# Altium footprint library PCB_Kursus_Library.PcbLib: 27 footprints (part 1 of 2)
Each footprint in its own frame and in the unit in brackets; x right, y up, seen from the top. Pads: shape width x height; smd on the part's side, far side on the other; paste and mask are expansions set on the pad; w line width, h text height; cw(c..) or ccw(c..) is an arc to the next point about the centre after c.
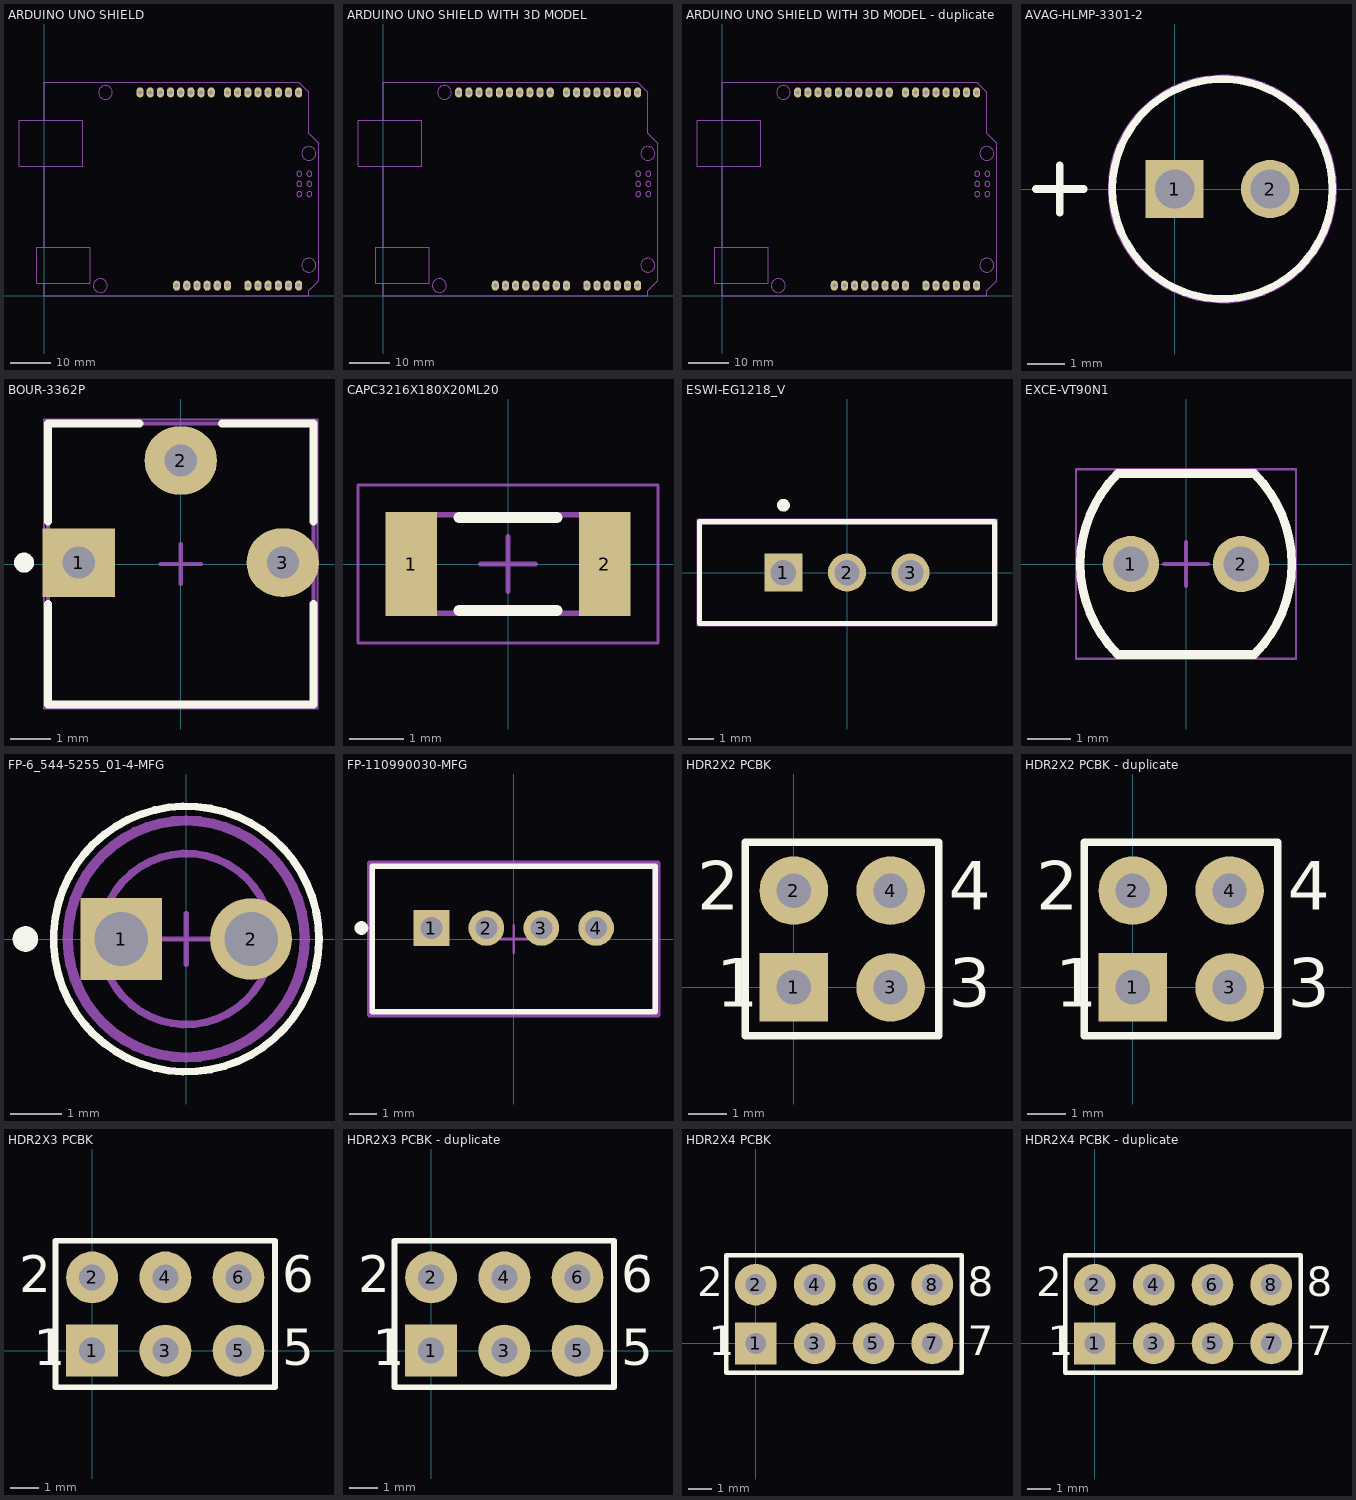
[diagram p0: the footprints below, top view; thin cyan lines are the x and y axes]

## ARDUINO UNO SHIELD [mil]
pads (28):
  oval 70x100 hole 39.37: 1(1300,100) 2(1400,100) 3(1500,100) 4(1600,100) 5(1700,100) 6(1800,100) 7(2000,100) 8(2100,100) 9(2200,100) 10(2300,100) 11(2400,100) 12(2500,100) 13(2500,2000) 14(2400,2000) 15(2300,2000) 16(2200,2000) 17(2100,2000) 18(2000,2000) 19(1900,2000) 20(1800,2000) 21(1640,2000) 22(1540,2000) 23(1440,2000) 24(1340,2000) 25(1240,2000) 26(1140,2000) 27(1040,2000) 28(940,2000)
Mechanical 1:
  circle w10: c550,100 r68
  circle w10: c600,2000 r68
  circle w10: c2600,1400 r68
  circle w10: c2600,300 r68
  circle w10: c2505,1200 r25
  circle w10: c2605,1200 r25
  circle w10: c2505,1100 r25
  circle w10: c2605,1100 r25
  circle w10: c2505,1000 r25
  circle w10: c2605,1000 r25
  lines w10: 0,125 0,0 2600,0 2600,50 2700,150 2700,1500 2600,1600 2600,2000 2500,2100 0,2100 0,1725 ; 0,125 -75,125 -75,475 0,475 ; 0,125 375,125 450,125 450,475 375,475 0,475 ; 0,475 0,1275 ; 0,1275 -250,1275 -250,1725 0,1725 ; 0,1275 375,1275 375,1725 275,1725 0,1725

## ARDUINO UNO SHIELD WITH 3D MODEL [mil]
pads (32):
  oval 70x100 hole 39.37: 1(1300,100) 2(1400,100) 3(1500,100) 4(1600,100) 5(1700,100) 6(1800,100) 7(2000,100) 8(2100,100) 9(2200,100) 10(2300,100) 11(2400,100) 12(2500,100) 13(2500,2000) 14(2400,2000) 15(2300,2000) 16(2200,2000) 17(2100,2000) 18(2000,2000) 19(1900,2000) 20(1800,2000) 21(1640,2000) 22(1540,2000) 23(1440,2000) 24(1340,2000) 25(1240,2000) 26(1140,2000) 27(1040,2000) 28(940,2000) 29(840,2000) 30(740,2000) 31(1200,100) 32(1100,100)
Mechanical 2:
  circle w10: c550,100 r68
  circle w10: c2600,300 r68
  circle w10: c2605,1000 r25
  circle w10: c2505,1000 r25
  circle w10: c2605,1100 r25
  circle w10: c2505,1100 r25
  circle w10: c2605,1200 r25
  circle w10: c2505,1200 r25
  circle w10: c2600,1400 r68
  circle w10: c600,2000 r68
  lines w10: 0,125 -75,125 -75,475 0,475 ; 0,125 0,0 2600,0 2600,50 2700,150 2700,1500 2600,1600 2600,2000 2500,2100 0,2100 0,1725 ; 0,125 375,125 450,125 450,475 375,475 0,475 ; 0,475 0,1275 ; 0,1275 -250,1275 -250,1725 0,1725 ; 0,1275 375,1275 375,1725 275,1725 0,1725
3D body "arduino uno rev3 pinheader v4.step": height 57.01, standoff -663.04, extent -250,0 2700,2100

## ARDUINO UNO SHIELD WITH 3D MODEL - duplicate [mil]
pads (32):
  oval 70x100 hole 39.37: 1(1300,100) 2(1400,100) 3(1500,100) 4(1600,100) 5(1700,100) 6(1800,100) 7(2000,100) 8(2100,100) 9(2200,100) 10(2300,100) 11(2400,100) 12(2500,100) 13(2500,2000) 14(2400,2000) 15(2300,2000) 16(2200,2000) 17(2100,2000) 18(2000,2000) 19(1900,2000) 20(1800,2000) 21(1640,2000) 22(1540,2000) 23(1440,2000) 24(1340,2000) 25(1240,2000) 26(1140,2000) 27(1040,2000) 28(940,2000) 29(840,2000) 30(740,2000) 31(1200,100) 32(1100,100)
Mechanical 2:
  circle w10: c600,2000 r68
  circle w10: c2600,1400 r68
  circle w10: c2505,1200 r25
  circle w10: c2605,1200 r25
  circle w10: c2505,1100 r25
  circle w10: c2605,1100 r25
  circle w10: c2505,1000 r25
  circle w10: c2605,1000 r25
  circle w10: c2600,300 r68
  circle w10: c550,100 r68
  lines w10: 0,125 375,125 450,125 450,475 375,475 0,475 ; 0,125 0,0 2600,0 2600,50 2700,150 2700,1500 2600,1600 2600,2000 2500,2100 0,2100 0,1725 ; 0,125 -75,125 -75,475 0,475 ; 0,475 0,1275 ; 0,1275 375,1275 375,1725 275,1725 0,1725 ; 0,1275 -250,1275 -250,1725 0,1725
3D body "arduino uno rev3 pinheader v4.step": height 57.01, standoff -663.04, extent -250,0 2700,2100

## AVAG-HLMP-3301-2 [mm] "THD, 2-Leads, Body Dia 5.85mm"
pads (2):
  rect 1.55x1.55 hole 1.05: 1(0,0)
  round 1.55 hole 1.05: 2(2.54,0)
Top Overlay:
  circle w0.2: c1.27,0 r2.923
  lines w0.2: -3.683,0 -2.413,0 ; -3.048,-0.635 -3.048,0.635
Mechanical 13:
  circle w0.1: c1.27,0 r2.923
Mechanical 15:
  circle w0.05: c1.27,0 r3.023

## BOUR-3362P [mm]
pads (3):
  rect 1.8x1.7 hole 0.8: 1(-2.54,0.035)
  oval 1.8x1.7 hole 0.8: 2(0,2.575) 3(2.54,0.035)
Top Overlay:
  circle w0.25: c-3.9,0.035 r0.125
  lines w0.2: -3.3,-0.99 -3.3,-3.495 3.3,-3.495 3.3,-0.99 ; -3.3,1.06 -3.3,3.495 -1.025,3.495 ; 1.025,3.495 3.3,3.495 3.3,1.06
Mechanical 13:
  lines w0.1: -3.3,-3.495 3.3,-3.495 3.3,3.495 -3.3,3.495 -3.3,-3.495
Mechanical 15:
  lines w0.05: -3.4,-3.595 -3.4,3.595 3.4,3.595 3.4,-3.595 -3.4,-3.595
  lines w0.1: -0.5,0 0.5,0 ; 0,-0.5 0,0.5
3D body "User Library-R_3362P.STEP": height 4.5, standoff -3, extent -3.3,-3.495 3.3,3.495

## CAPC3216X180X20ML20 [mm]
pads (2):
  rect 0.95x1.9 smd: 1(-1.775,0) 2(1.775,0)
Top Overlay:
  lines w0.2: -0.9,-0.85 0.9,-0.85 ; -0.9,0.85 0.9,0.85
Mechanical 13:
  lines w0.1: -1.7,-0.9 1.7,-0.9 1.7,0.9 -1.7,0.9 -1.7,-0.9
Mechanical 15:
  lines w0.05: -2.75,-1.45 2.75,-1.45 2.75,1.45 -2.75,1.45 -2.75,-1.45
  lines w0.1: -0.5,0 0.5,0 ; 0,-0.5 0,0.5
3D body "CAPC3216X18M.step": height 1.8, standoff 0, extent -1.7,-0.9 1.7,0.9

## ESWI-EG1218_V [mm]
pads (3):
  rect 1.5x1.5 hole 1: 1(-2.5,0)
  round 1.5 hole 1: 2(0,0) 3(2.5,0)
Top Overlay:
  circle w0.25: c-2.5,2.65 r0.125
  lines w0.2: -5.8,-2 -5.8,2 5.8,2 5.8,-2 -5.8,-2
Mechanical 13:
  lines w0.1: -5.8,-2 -5.8,2 5.8,2 5.8,-2 -5.8,-2
Mechanical 15:
  lines w0.05: -5.9,-2.1 -5.9,2.1 5.9,2.1 5.9,-2.1 -5.9,-2.1
  lines w0.1: -0.5,0 0.5,0 ; 0,-0.5 0,0.5
3D body "User Library-EG1218.STEP": height 7.4, standoff -4.7, extent -5.8,-2 5.8,2

## EXCE-VT90N1 [mm]
pads (2):
  round 1.3 hole 0.8: 1(-1.27,0) 2(1.27,0)
Top Overlay:
  lines w0.2: -1.575,-2.085 cw(c0.51,0) -1.575,2.085 1.575,2.085 cw(c-0.51,0) 1.575,-2.085 -1.575,-2.085
Mechanical 13:
  lines w0.1: -1.575,-2.085 cw(c0.51,0) -1.575,2.085 1.575,2.085 cw(c-0.51,0) 1.575,-2.085 -1.575,-2.085
Mechanical 15:
  lines w0.05: -2.54,-2.185 2.54,-2.185 2.54,2.185 -2.54,2.185 -2.54,-2.185
  lines w0.1: -0.5,0 0.5,0 ; 0,-0.5 0,0.5
3D body: height 2.29, standoff 0, extent -2.439,-2.086 2.439,2.086

## FP-6_544-5255_01-4-MFG [mm]
pads (2):
  rect 1.6x1.6 hole 1.05 paste-2539.97 mask+0: 1(-1.27,0)
  round 1.6 hole 1.05 paste-2539.97 mask+0: 2(1.27,0)
Top Overlay:
  circle w0.15: c0,0 r2.6
  circle w0.25: c-3.15,0 r0.125
Top 3D Body:
  circle w0.15: c0,0 r1.675
Top Courtyard:
  lines w0.2: -2.319,0 ccw(c0,0) 2.319,0 ccw(c0,0) -2.319,0
Top Assembly:
  text ".Designator" at 0,0.188 h1
Top Component Center:
  lines w0.1: -0.5,0 0.5,0 ; 0,-0.5 0,0.5
3D body "Diode_Vishay_TLLG4401_eec.STEP": height 0.25, standoff 0, extent -2.319,-2.319 2.319,2.319

## FP-110990030-MFG [mm]
pads (4):
  rect 1.3x1.3 hole 0.8 paste-2539.97 mask+0: 1(-3,0.4)
  round 1.3 hole 0.8 paste-2539.97 mask+0: 2(-1,0.4) 3(1,0.4) 4(3,0.4)
Top Overlay:
  circle w0.25: c-5.55,0.4 r0.125
  lines w0.2: -5.15,-2.65 5.15,-2.65 5.15,2.65 -5.15,2.65 -5.15,-2.65
Top Courtyard:
  lines w0.2: -5.25,-2.75 5.25,-2.75 5.25,2.75 -5.25,2.75 -5.25,-2.75
Top Assembly:
  lines w0.2: -5.25,-2.75 5.25,-2.75 5.25,2.75 -5.25,2.75 -5.25,-2.75
  text ".Designator" at 0,0.188 h1
Board Shape:
  lines w0.2: -5.15,-2.65 5.15,-2.65 5.15,2.65 -5.15,2.65 -5.15,-2.65
Top Component Center:
  lines w0.1: -0.5,0 0.5,0 ; 0,-0.5 0,0.5
3D body "Conn_Seeed_Studio_110990030_eec.STEP": height 0.25, standoff 0, extent -5.25,-2.75 5.25,2.75

## HDR2X2 PCBK [mm]
pads (4):
  rect 1.8x1.8 hole 0.9: 1(0,0)
  round 1.8 hole 0.9: 2(0,2.54) 3(2.54,0) 4(2.54,2.54)
Top Overlay:
  lines w0.2: -1.27,-1.27 -1.27,3.81 3.81,3.81 3.81,-1.27 -1.27,-1.27
  text "1" at -2.032,-0.508 h1.27
  text "2" at -2.54,2.032 h1.27
  text "4" at 4.064,2.032 h1.27
  text "3" at 4.064,-0.508 h1.27
3D body "4-Pin Header - Male - Double - 2.54mm.step": height 8.89, standoff -3.05, extent -1.27,-1.27 3.81,3.81

## HDR2X2 PCBK - duplicate [mm]
pads (4):
  rect 1.8x1.8 hole 0.9: 1(0,0)
  round 1.8 hole 0.9: 2(0,2.54) 3(2.54,0) 4(2.54,2.54)
Top Overlay:
  lines w0.2: -1.27,-1.27 -1.27,3.81 3.81,3.81 3.81,-1.27 -1.27,-1.27
  text "1" at -2.032,-0.508 h1.27
  text "2" at -2.54,2.032 h1.27
  text "4" at 4.064,2.032 h1.27
  text "3" at 4.064,-0.508 h1.27
3D body "4-Pin Header - Male - Double - 2.54mm.step": height 8.89, standoff -3.05, extent -1.27,-1.27 3.81,3.81

## HDR2X3 PCBK [mm]
pads (6):
  rect 1.8x1.8 hole 0.9: 1(0,0)
  round 1.8 hole 0.9: 2(0,2.54) 3(2.54,0) 4(2.54,2.54) 5(5.08,0) 6(5.08,2.54)
Top Overlay:
  lines w0.2: 1.482,-1.27 6.35,-1.27 ; 6.35,-1.27 -1.27,-1.27 -1.27,3.81 6.35,3.81 6.35,-1.27
  text "1" at -2.032,-0.508 h1.27
  text "2" at -2.54,2.032 h1.27
  text "5" at 6.604,-0.508 h1.27
  text "6" at 6.604,2.032 h1.27
3D body "pinheader 2x3 and 2 jumpers.stp": height 9, standoff -2.99, extent -1.27,-1.27 6.35,3.81

## HDR2X3 PCBK - duplicate [mm]
pads (6):
  rect 1.8x1.8 hole 0.9: 1(0,0)
  round 1.8 hole 0.9: 2(0,2.54) 3(2.54,0) 4(2.54,2.54) 5(5.08,0) 6(5.08,2.54)
Top Overlay:
  lines w0.2: 1.482,-1.27 6.35,-1.27 ; 6.35,-1.27 6.35,3.81 -1.27,3.81 -1.27,-1.27 6.35,-1.27
  text "6" at 6.604,2.032 h1.27
  text "5" at 6.604,-0.508 h1.27
  text "2" at -2.54,2.032 h1.27
  text "1" at -2.032,-0.508 h1.27
3D body "pinheader 2x3 and 2 jumpers.stp": height 9, standoff -2.99, extent -1.27,-1.27 6.35,3.81

## HDR2X4 PCBK [mm]
pads (8):
  rect 1.8x1.8 hole 0.9: 1(0,0)
  round 1.8 hole 0.9: 2(0,2.54) 3(2.54,0) 4(2.54,2.54) 5(5.08,0) 6(5.08,2.54) 7(7.62,0) 8(7.62,2.54)
Top Overlay:
  lines w0.2: -1.27,-1.27 -1.27,3.81 8.89,3.81 8.89,-1.27 -1.27,-1.27
  text "8" at 9.144,2.032 h1.27
  text "7" at 9.144,-0.508 h1.27
  text "1" at -2.032,-0.508 h1.27
  text "2" at -2.54,2.032 h1.27
3D body "8-Pin Header - Male - Double - 2.54mm.step": height 8.89, standoff -3.05, extent -1.27,-1.27 8.89,3.81

## HDR2X4 PCBK - duplicate [mm]
pads (8):
  rect 1.8x1.8 hole 0.9: 1(0,0)
  round 1.8 hole 0.9: 2(0,2.54) 3(2.54,0) 4(2.54,2.54) 5(5.08,0) 6(5.08,2.54) 7(7.62,0) 8(7.62,2.54)
Top Overlay:
  lines w0.2: -1.27,-1.27 8.89,-1.27 8.89,3.81 -1.27,3.81 -1.27,-1.27
  text "2" at -2.54,2.032 h1.27
  text "1" at -2.032,-0.508 h1.27
  text "7" at 9.144,-0.508 h1.27
  text "8" at 9.144,2.032 h1.27
3D body "8-Pin Header - Male - Double - 2.54mm.step": height 8.89, standoff -3.05, extent -1.27,-1.27 8.89,3.81